# Altium footprint library LUCHADOR PCBLIB.PcbLib: 75 footprints (part 3 of 5)
Each footprint in its own frame and in the unit in brackets; x right, y up, seen from the top. Pads: shape width x height; smd on the part's side, far side on the other; paste and mask are expansions set on the pad; w line width, h text height; cw(c..) or ccw(c..) is an arc to the next point about the centre after c.
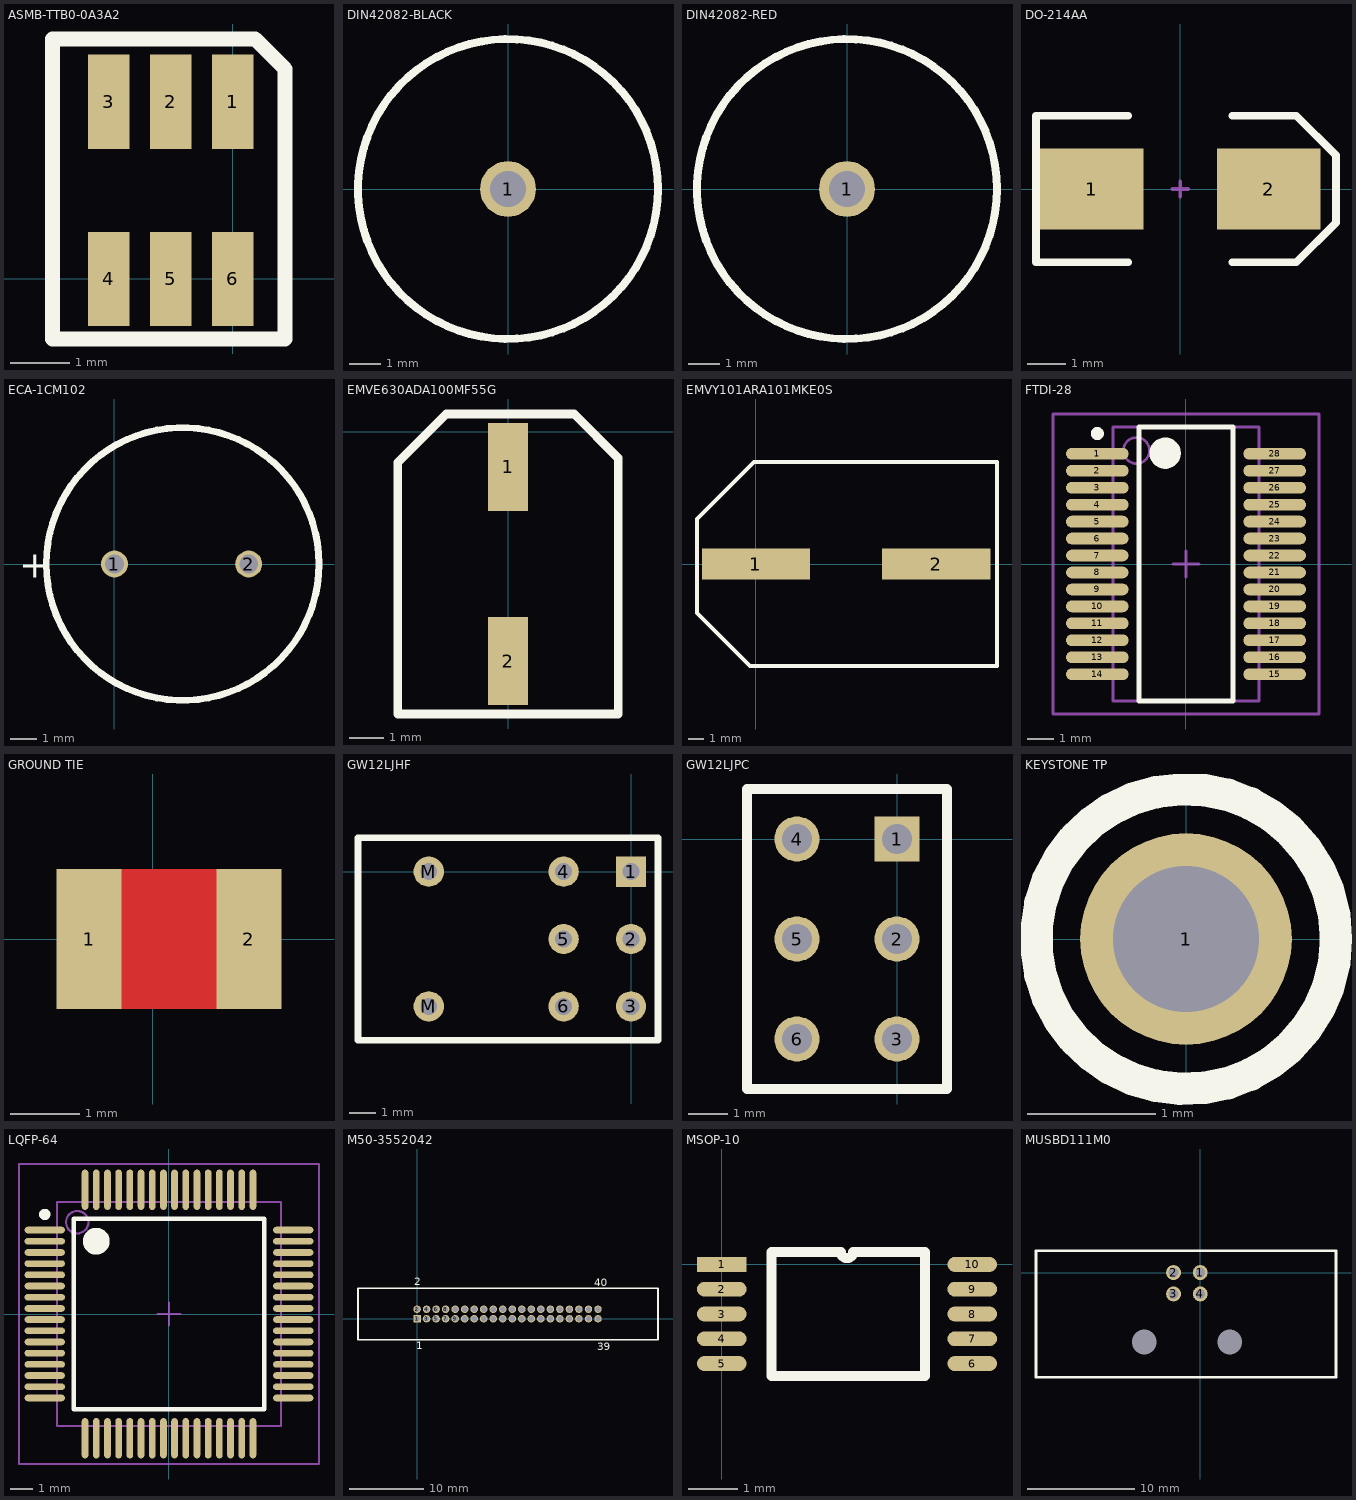
[diagram p2: the footprints below, top view; thin cyan lines are the x and y axes]

## ASMB-TTB0-0A3A2 [mm]
pads (6):
  rect 0.7x1.6 smd: 1(0,3) 2(-1.05,3) 3(-2.1,3) 4(-2.1,0) 5(-1.05,0) 6(0,0)
Top Overlay:
  lines w0.254: -3.048,-1.016 0.889,-1.016 0.889,3.556 0.381,4.064 -3.048,4.064 -3.048,-1.016
3D body "ASMB LED.STEP": height 2.89, standoff 0.01, extent -2.915,-0.481 0.781,3.377

## DIN42082-BLACK [mil]
pads (1):
  round 70 hole 45: 1(0,0)
Top Overlay:
  circle w10: c0,0 r188.04
3D body "DIN42082-BLACK.STEP": height 592.39, standoff -127.61, extent -187.11,-186.74 187.1,186.74

## DIN42082-RED [mil]
pads (1):
  round 70 hole 45: 1(0,0)
Top Overlay:
  circle w10: c0,0 r188.04
3D body "DIN42082-RED.STEP": height 592.39, standoff -127.61, extent -187.11,-186.74 187.11,186.74

## DO-214AA [mm] "DO-214-AC/SMA; 2 C-Bend Leads; Body 5.3 x 2.6 mm, inc. leads (LxW)"
height 2.3
pads (2):
  rect 2.7x2.1 smd: 1(-2.3,0) 2(2.3,0)
Top Overlay:
  lines w0.2: -1.35,-1.905 -3.75,-1.905 -3.75,1.905 -1.35,1.905 ; 1.35,-1.905 3.02,-1.905 4.05,-0.875 4.05,0.875 3.02,1.905 1.35,1.905
Mechanical 1:
  lines w0.1: -0.2,0 0.2,0 ; 0,-0.2 0,0.2
3D body "User Library-DIOM5539X24.STEP": height 2.45, standoff 0.03, extent -2.623,-1.95 2.877,1.95

## ECA-1CM102 [mm]
pads (2):
  round 1 hole 0.7: 1(0,0) 2(5,0)
Top Overlay:
  circle w0.254: c2.54,0 r5.08
  text "+" at -3.556,-0.508 h1.02
3D body "ECA-1CM102.STEP": height 16.01, standoff -3.04, extent -2.511,-4.99 7.489,4.99

## EMVE630ADA100MF55G [mil]
pads (2):
  rect 45x100 smd: 1(0,-40) 2(0,-260)
Top Overlay:
  lines w10: -125,-320 -30,-320 125,-320 125,-30 75,20 -70,20 -125,-35 -125,-320
3D body "EMVE630ADA100MF55G.STEP": height 275.83, standoff 0.48, extent -124,-289.63 124.03,-8.37

## EMVY101ARA101MKE0S [mm]
pads (2):
  rect 7x2 smd: 1(0,0) 2(11.684,0)
Top Overlay:
  lines w0.254: -3.81,-3.175 -3.81,2.921 -0.127,6.604 15.621,6.604 15.621,-1.397 15.621,-6.604 -0.381,-6.604 -3.81,-3.175
3D body "EMVY101ARA101MKE0S.STEP": height 16.21, standoff 0.01, extent -1.264,-6.449 12.929,6.551

## FTDI-28 [mm] "SOP, 28-Leads, Body 10.2x5.3mm, Pitch 0.65mm, IPC Low Density"
height 2
pads (28):
  oval 2.4x0.45 smd: 1(-3.4,4.225) 2(-3.4,3.575) 3(-3.4,2.925) 4(-3.4,2.275) 5(-3.4,1.625) 6(-3.4,0.975) 7(-3.4,0.325) 8(-3.4,-0.325) 9(-3.4,-0.975) 10(-3.4,-1.625) 11(-3.4,-2.275) 12(-3.4,-2.925) 13(-3.4,-3.575) 14(-3.4,-4.225) 15(3.4,-4.225) 16(3.4,-3.575) 17(3.4,-2.925) 18(3.4,-2.275) 19(3.4,-1.625) 20(3.4,-0.975) 21(3.4,-0.325) 22(3.4,0.325) 23(3.4,0.975) 24(3.4,1.625) 25(3.4,2.275) 26(3.4,2.925) 27(3.4,3.575) 28(3.4,4.225)
Top Overlay:
  circle w0.6: c-0.8,4.25 r0.3
  circle w0.25: c-3.4,5 r0.125
  lines w0.2: -1.8,-5.25 1.8,-5.25 1.8,5.25 -1.8,5.25 -1.8,-5.25
Mechanical 13:
  circle w0.1: c-1.9,4.35 r0.5
  lines w0.1: -2.8,-5.25 2.8,-5.25 2.8,5.25 -2.8,5.25 -2.8,-5.25
Mechanical 15:
  lines w0.1: -0.5,0 0.5,0 ; 0,-0.5 0,0.5 ; -5.1,-5.75 5.1,-5.75 5.1,5.75 -5.1,5.75 -5.1,-5.75
3D body "User Library-SSOP-28-2.STEP": height 1.98, standoff -0.02, extent -3.804,-5.105 4.008,5.095

## GROUND TIE [mil] "Chip Resistor, Body 2.0x1.3mm, IPC Low Density"
height 25.59
pads (2):
  rect 37.4x80 smd: 1(-36.42,0) 2(55,0)
Top Layer:
  rectangle: -20,-40 40,40

## GW12LJHF [mil]
pads (8):
  rect 45x45 hole 25 unplated: 1(0,0)
  round 45 hole 25 unplated: 2(0,-100) 3(0,-200) 4(-100,0) 5(-100,-100) 6(-100,-200) M(-300,-200) M(-300,0)
Top Overlay:
  lines w10: -405,-250 -405,50 40,50 40,0 40,-250 -405,-250
3D body "GW12LJHF.stp": height 212.98, standoff -127.52, extent -552.08,-248 8.01,48

## GW12LJPC [mil]
pads (6):
  rect 45x45 hole 30: 1(0,0)
  round 45 hole 30: 2(0,-100) 3(0,-200) 4(-100,0) 5(-100,-100) 6(-100,-200)
Top Overlay:
  lines w10: -150,-250 -150,50 50,50 50,-250 -150,-250
3D body "GW12LJPC.stp": height 426.57, standoff -101.52, extent -148.5,-248 48.5,48

## KEYSTONE TP [mil]
pads (1):
  round 65 hole 45: 1(0,0)
Top Overlay:
  circle w10: c0,0 r46.1

## LQFP-64 [mm] "Thin QFP, 64-Leads, Body 10x10mm, Pitch 0.5mm, IPC Medium Density"
height 1.6
pads (64):
  oval 1.8x0.3 smd: 1(-5.55,3.75) 2(-5.55,3.25) 3(-5.55,2.75) 4(-5.55,2.25) 5(-5.55,1.75) 6(-5.55,1.25) 7(-5.55,0.75) 8(-5.55,0.25) 9(-5.55,-0.25) 10(-5.55,-0.75) 11(-5.55,-1.25) 12(-5.55,-1.75) 13(-5.55,-2.25) 14(-5.55,-2.75) 15(-5.55,-3.25) 16(-5.55,-3.75) 33(5.55,-3.75) 34(5.55,-3.25) 35(5.55,-2.75) 36(5.55,-2.25) 37(5.55,-1.75) 38(5.55,-1.25) 39(5.55,-0.75) 40(5.55,-0.25) 41(5.55,0.25) 42(5.55,0.75) 43(5.55,1.25) 44(5.55,1.75) 45(5.55,2.25) 46(5.55,2.75) 47(5.55,3.25) 48(5.55,3.75)
  oval 0.3x1.8 smd: 17(-3.75,-5.55) 18(-3.25,-5.55) 19(-2.75,-5.55) 20(-2.25,-5.55) 21(-1.75,-5.55) 22(-1.25,-5.55) 23(-0.75,-5.55) 24(-0.25,-5.55) 25(0.25,-5.55) 26(0.75,-5.55) 27(1.25,-5.55) 28(1.75,-5.55) 29(2.25,-5.55) 30(2.75,-5.55) 31(3.25,-5.55) 32(3.75,-5.55) 49(3.75,5.55) 50(3.25,5.55) 51(2.75,5.55) 52(2.25,5.55) 53(1.75,5.55) 54(1.25,5.55) 55(0.75,5.55) 56(0.25,5.55) 57(-0.25,5.55) 58(-0.75,5.55) 59(-1.25,5.55) 60(-1.75,5.55) 61(-2.25,5.55) 62(-2.75,5.55) 63(-3.25,5.55) 64(-3.75,5.55)
Top Overlay:
  circle w0.25: c-5.55,4.45 r0.125
  circle w0.6: c-3.25,3.25 r0.3
  lines w0.2: -4.25,-4.25 -4.25,4.25 4.25,4.25 4.25,-4.25 -4.25,-4.25
Mechanical 13:
  circle w0.1: c-4.1,4.1 r0.5
  lines w0.1: -5,-5 -5,5 5,5 5,-5 -5,-5
Mechanical 15:
  lines w0.1: -0.5,0 0.5,0 ; 0,-0.5 0,0.5 ; -6.7,-6.7 -6.7,6.7 6.7,6.7 6.7,-6.7 -6.7,-6.7
3D body "User Library-LQFP-64.STEP": height 1.4, standoff -0.31, extent -5.994,-6 6.006,6

## M50-3552042 [mm]
pads (40):
  rect 1x1 hole 0.7: 1(0,0)
  round 1 hole 0.7: 2(0,1.27) 3(1.27,0) 4(1.27,1.27) 5(2.54,0) 6(2.54,1.27) 7(3.81,0) 8(3.81,1.27) 9(5.08,0) 10(5.08,1.27) 11(6.35,0) 12(6.35,1.27) 13(7.62,0) 14(7.62,1.27) 15(8.89,0) 16(8.89,1.27) 17(10.16,0) 18(10.16,1.27) 19(11.43,0) 20(11.43,1.27) 21(12.7,0) 22(12.7,1.27) 23(13.97,0) 24(13.97,1.27) 25(15.24,0) 26(15.24,1.27) 27(16.51,0) 28(16.51,1.27) 29(17.78,0) 30(17.78,1.27) 31(19.05,0) 32(19.05,1.27) 33(20.32,0) 34(20.32,1.27) 35(21.59,0) 36(21.59,1.27) 37(22.86,0) 38(22.86,1.27) 39(24.13,0) 40(24.13,1.27)
Top Overlay:
  lines w0.254: -7.874,-2.794 -7.874,4.064 32.131,4.064 32.131,-2.794 -7.874,-2.794
  text "40" at 23.622,4.318 h1.02
  text "39" at 24.003,-4.191 h1.02
  text "2" at -0.381,4.445 h1.02
  text "1" at -0.127,-4.064 h1.02
3D body "m50-3552042_asm.stp": height 11.32, standoff -2.71, extent -7.85,-2.692 32.03,3.978

## MSOP-10 [mm]
pads (10):
  rect 1x0.3 smd: 1(0,0)
  oval 1x0.3 smd: 2(0,-0.5) 3(0,-1) 4(0,-1.5) 5(0,-2) 6(5.05,-2) 7(5.05,-1.5) 8(5.05,-1) 9(5.05,-0.5) 10(5.05,0)
Top Overlay:
  lines w0.2: 1,-2.25 1,0.25 2.4,0.25 ccw(c2.525,0.25) 2.65,0.25 4.1,0.25 4.1,-2.25 1,-2.25
3D body "User Library-msop-10.STEP": height 1.15, standoff 0, extent 0.065,-2.516 4.965,0.484

## MUSBD111M0 [mm]
pads (6):
  round 1.4 hole 0.92: 1(0,0) 2(-2.5,0) 3(-2.5,-2) 4(0,-2)
  round 0 hole 2.3 unplated: M(-5.25,-6.49) M(2.75,-6.49)
Top Overlay:
  lines w0.254: -15.367,-9.779 12.7,-9.779 12.7,2.032 -15.367,2.032 -15.367,-9.779
3D body "M-MUSB-D111-M0-REVT1.STEP": height 15.51, standoff -2.59, extent -15.321,-15.968 12.679,2.032